# Altium footprint library pioneer_2-bluepill_eletronic_wrapper.PcbLib: 26 footprints (part 1 of 2)
Each footprint in its own frame and in the unit in brackets; x right, y up, seen from the top. Pads: shape width x height; smd on the part's side, far side on the other; paste and mask are expansions set on the pad; w line width, h text height; cw(c..) or ccw(c..) is an arc to the next point about the centre after c.
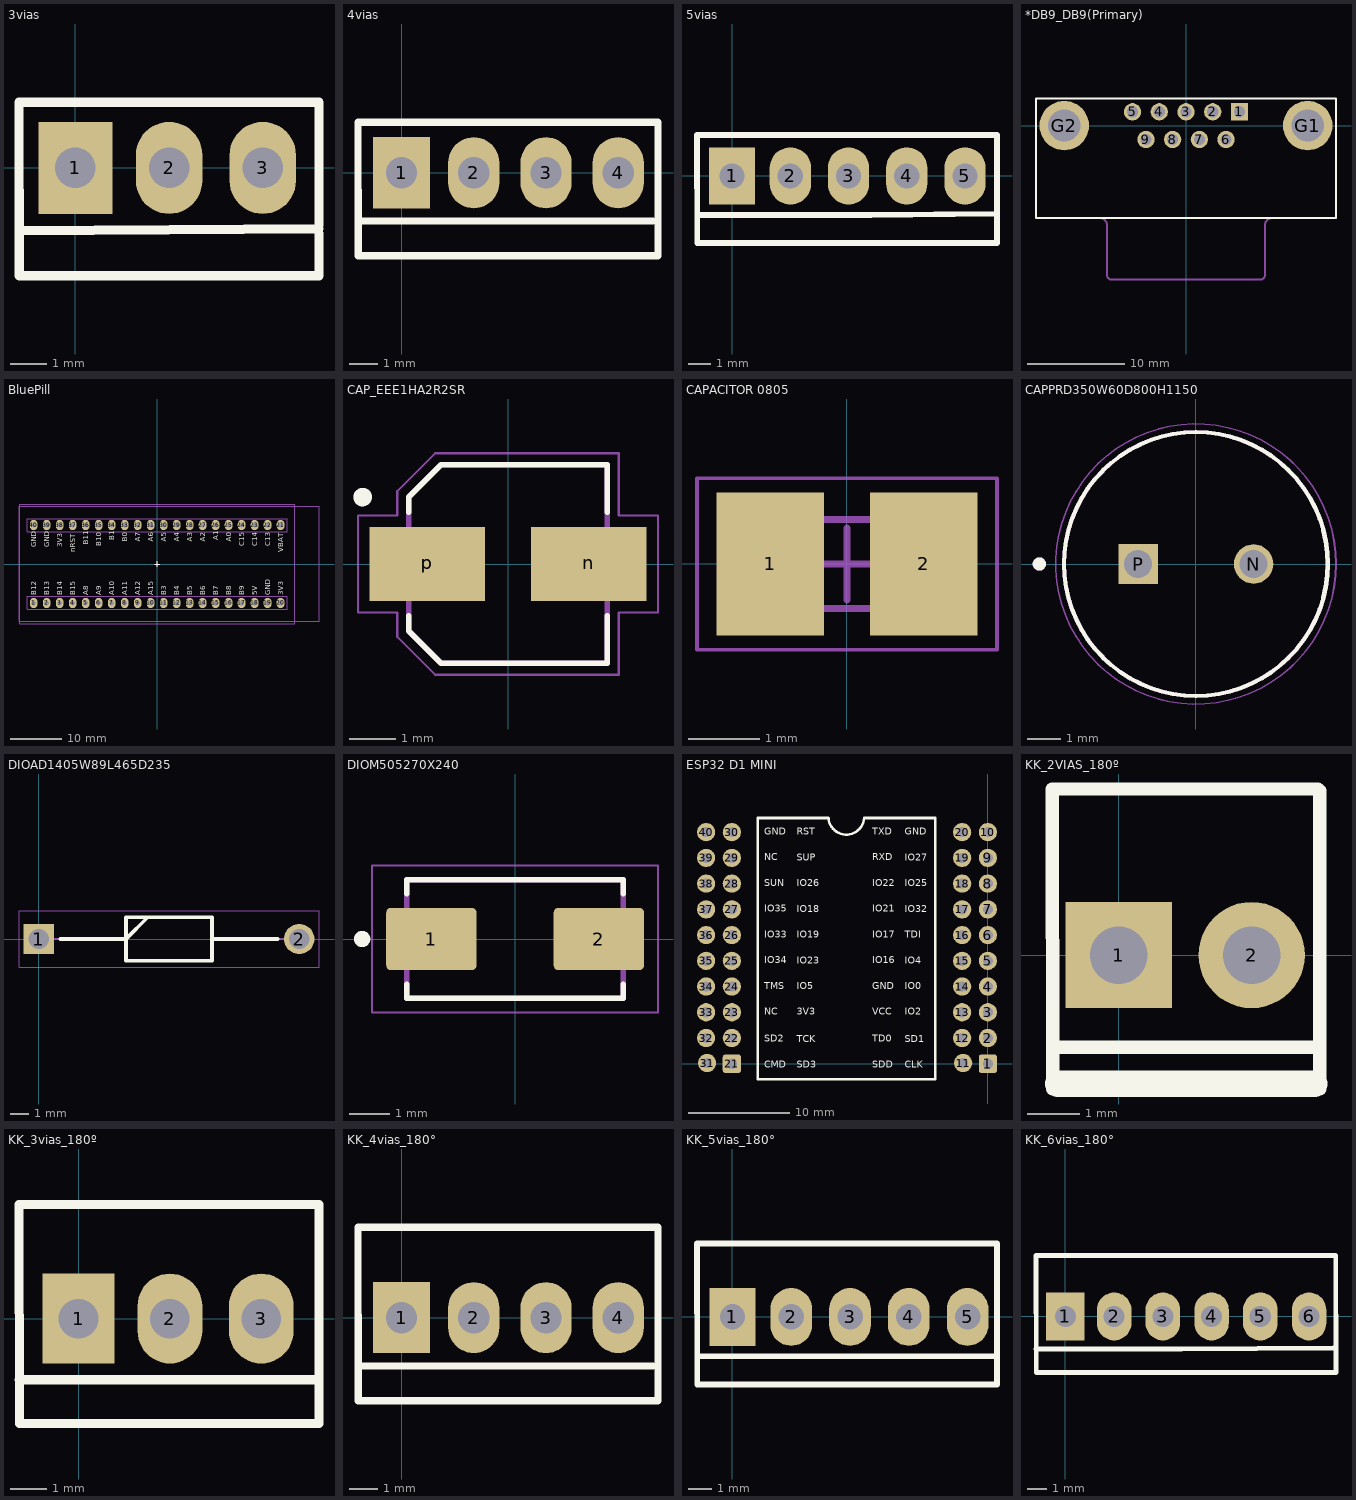
[diagram p0: the footprints below, top view; thin cyan lines are the x and y axes]

## 3vias [mm]
pads (3):
  rect 2x2.5 hole 1.1: 1(0,0)
  oval 1.8x2.5 hole 1.1: 2(2.54,0) 3(5.08,0)
Top Overlay:
  lines w0.254: -1.524,-1.7 6.604,-1.651 ; 6.604,-1.767 6.604,-2.921 -1.523,-2.921 -1.531,1.778 6.604,1.778 6.604,0.667 6.604,-1.556

## 4vias [mm]
pads (4):
  rect 2x2.5 hole 1.1: 1(0,0)
  oval 1.8x2.5 hole 1.1: 2(2.54,0) 3(5.08,0) 4(7.62,0)
Top Overlay:
  lines w0.254: -1.534,1.778 6.685,1.778 9.017,1.778 9.017,-2.667 9.017,-2.921 6.685,-2.921 -1.523,-2.921 -1.531,1.778 ; -1.524,-1.7 6.05,-1.7 8.841,-1.7

## 5vias [mm]
pads (5):
  rect 2x2.5 hole 1.1: 1(0,0)
  oval 1.8x2.5 hole 1.1: 2(2.54,0) 3(5.08,0) 4(7.62,0) 5(10.16,0)
Top Overlay:
  lines w0.254: -1.534,1.778 6.685,1.778 11.557,1.778 11.557,-2.921 9.017,-2.921 6.685,-2.921 -1.523,-2.921 -1.531,1.778 ; -1.524,-1.7 6.05,-1.7 11.557,-1.651

## *DB9_DB9(Primary) [mil]
pads (11):
  rect 70x70 hole 45: 1(216,56)
  round 70 hole 45: 2(108,56) 3(0,56) 4(-108,56) 5(-216,56) 6(162,-56) 7(54,-56) 8(-54,-56) 9(-162,-56)
  round 200 hole 130: G1(492,0) G2(-492,0)
Top Overlay:
  lines w8: -606.3,-374.02 -606.3,110.24 606.3,110.24 606.3,-374.02 -606.3,-374.02
Mechanical 4:
  lines w8: -320,-602.32 ccw(c-300,-602.32) -300,-622.32 ; -320,-602.32 ccw(c-300,-602.32) -300,-622.32 ; -320,-602.32 -320,-402.32 -320,-602.32 ; -300,-622.32 300,-622.32 ; -300,-622.32 300,-622.32 ; 300,-622.32 ccw(c300,-602.32) 320,-602.32 ; 300,-622.32 ccw(c300,-602.32) 320,-602.32 ; 320,-602.32 320,-402.32 320,-602.32 ; -344.79,-374.03 cw(c-346.65,-400.67) -320.01,-402.53 ccw(c-346.65,-400.67) -344.79,-374.03 ; 320.01,-402.53 cw(c346.65,-400.67) 344.79,-374.03 ccw(c346.65,-400.67) 320.01,-402.53
3D body "DB9 Male Right Angle Connector.step": height 483.27, standoff -136.81, extent -606.5,-610 606.5,122.28

## BluePill [mm] "BluePill"
height 19.68
pads (40):
  oval 1.5x2 hole 0.9: 1(-24.13,-7.62) 2(-21.59,-7.62) 3(-19.05,-7.62) 4(-16.51,-7.62) 5(-13.97,-7.62) 6(-11.43,-7.62) 7(-8.89,-7.62) 8(-6.35,-7.62) 9(-3.81,-7.62) 10(-1.27,-7.62) 11(1.27,-7.62) 12(3.81,-7.62) 13(6.35,-7.62) 14(8.89,-7.62) 15(11.43,-7.62) 16(13.97,-7.62) 17(16.51,-7.62) 18(19.05,-7.62) 19(21.59,-7.62) 20(24.13,-7.62) 21(24.13,7.62) 22(21.59,7.62) 23(19.05,7.62) 24(16.51,7.62) 25(13.97,7.62) 26(11.43,7.62) 27(8.89,7.62) 28(6.35,7.62) 29(3.81,7.62) 30(1.27,7.62) 31(-1.27,7.62) 32(-3.81,7.62) 33(-6.35,7.62) 34(-8.89,7.62) 35(-11.43,7.62) 36(-13.97,7.62) 37(-16.51,7.62) 38(-19.05,7.62) 39(-21.59,7.62) 40(-24.13,7.62)
Top Overlay:
  lines w0.2: -0.5,0 0.5,0 ; 0,-0.5 0,0.5
  text "GND" at -23.622,3.302 h1
  text "GND" at -21.082,3.302 h1
  text "3V3" at -18.542,3.302 h1
  text "nRST" at -16.002,2.302 h1
  text "B11" at -13.462,3.802 h1
  text "B10" at -10.922,3.469 h1
  text "B1" at -8.382,4.635 h1
  text "B0" at -5.842,4.302 h1
  text "A7" at -3.302,4.302 h1
  text "A6" at -0.762,4.302 h1
  text "A5" at 1.778,4.302 h1
  text "A4" at 4.318,4.302 h1
  text "VBAT" at 24.638,2.302 h1
  text "C13" at 22.098,3.469 h1
  text "C14" at 19.558,3.469 h1
  text "C15" at 17.018,3.469 h1
  text "A0" at 14.478,4.302 h1
  text "A1" at 11.938,4.635 h1
  text "A2" at 9.398,4.302 h1
  text "A3" at 6.858,4.302 h1
  text "B5" at 6.858,-6.096 h1
  text "B6" at 9.398,-6.096 h1
  text "B7" at 11.938,-6.096 h1
  text "B8" at 14.478,-6.096 h1
  text "B9" at 17.018,-6.096 h1
  text "5V" at 19.558,-6.096 h1
  text "GND" at 22.098,-6.096 h1
  text "3V3" at 24.638,-6.096 h1
  text "B4" at 4.318,-6.096 h1
  text "B3" at 1.778,-6.096 h1
  text "A15" at -0.762,-6.096 h1
  text "A12" at -3.302,-6.096 h1
  text "A11" at -5.842,-6.096 h1
  text "A10" at -8.382,-6.096 h1
  text "A9" at -10.922,-6.096 h1
  text "A8" at -13.462,-6.096 h1
  text "B15" at -16.002,-6.096 h1
  text "B14" at -18.542,-6.096 h1
  text "B13" at -21.082,-6.096 h1
  text "B12" at -23.622,-6.096 h1
Mechanical 13:
  lines w0.1: -27,-11.227 31.648,-11.227 31.648,11.273 -27,11.273 -27,-11.227 ; -25.4,-8.89 25.4,-8.89 25.4,-6.35 -25.4,-6.35 -25.4,-8.89 ; -25.4,6.35 -25.4,8.89 25.4,8.89 25.4,6.35 -25.4,6.35
Mechanical 15:
  lines w0.05: -26.9,-11.7 26.9,-11.7 26.9,11.7 -26.9,11.7 -26.9,-11.7
  lines w0.1: -0.5,0 0.5,0 ; 0,-0.5 0,0.5
Mechanical 29:
  text ".Designator" at 0,0 h1.52
3D body "BluePill.STEP": height 19.68, standoff -2.09, extent -26.988,-11.227 31.648,11.273

## CAP_EEE1HA2R2SR [mm]
pads (2):
  rect 2.5x1.6 smd: n(1.75,0) p(-1.75,0)
Top Overlay:
  circle w0.2: c-3.15,1.45 r0.1
  lines w0.127: -2.15,-1.12 -2.15,-1.45 -1.45,-2.15 2.15,-2.15 2.15,-1.12 ; -2.15,1.12 -2.15,1.45 -1.45,2.15 2.15,2.15 2.15,1.12
Mechanical 13:
  circle w0.2: c-3.15,1.45 r0.1
  lines w0.127: -2.15,-1.45 -1.45,-2.15 2.15,-2.15 2.15,2.15 -1.45,2.15 -2.15,1.45 -2.15,-1.45
Mechanical 15:
  lines w0.05: -3.25,-1.05 -3.25,1.05 -2.4,1.05 -2.4,1.575 -1.575,2.4 2.4,2.4 2.4,1.05 3.25,1.05 3.25,-1.05 2.4,-1.05 2.4,-2.4 -1.575,-2.4 -2.4,-1.575 -2.4,-1.05 -3.25,-1.05
3D body "step_temp.STEP": height 5.8, standoff 0, extent -2.5,-2.15 2.5,2.15

## CAPACITOR 0805 [mm] "ceramic capacitor 0805"
height 0.6
pads (2):
  rect 1.5x2 smd: 1(-1.075,0) 2(1.075,0)
Bottom Overlay:
  lines w0.2: -0.2,-0.6 0.2,-0.6 ; -0.2,0.6 0.2,0.6
Mechanical 13:
  lines w0.1: -1,-0.625 1,-0.625 1,0.625 -1,0.625 -1,-0.625
Mechanical 15:
  lines w0.05: -2.1,-1.2 2.1,-1.2 2.1,1.2 -2.1,1.2 -2.1,-1.2
  lines w0.1: -0.5,0 0.5,0 ; 0,-0.5 0,0.5
3D body "Ceramic_Capacitor_0805_h24mil.step": height 0.61, standoff 0.01, extent -1,-0.625 1,0.625

## CAPPRD350W60D800H1150 [mm]
pads (2):
  round 1.2 hole 0.85: N(1.75,0)
  rect 1.2x1.2 hole 0.85: P(-1.75,0)
Top Overlay:
  circle w0.127: c0,0 r4
  circle w0.2: c-4.75,0 r0.1
Mechanical 13:
  circle w0.127: c0,0 r4
  circle w0.2: c-4.75,0 r0.1
Mechanical 15:
  circle w0.05: c0,0 r4.25
3D body "step_temp.STEP": height 11.5, standoff -17, extent -4,-3.992 4,3.992

## DIOAD1405W89L465D235 [mm]
pads (2):
  rect 1.65x1.65 hole 1.1: 1(0,0)
  round 1.65 hole 1.1: 2(14.1,0)
Top Overlay:
  lines w0.2: 1.175,0 4.725,0 5.9,1.175 ; 9.375,0 12.925,0 ; 4.725,-1.175 4.725,1.175 9.375,1.175 9.375,-1.175 4.725,-1.175
Mechanical 13:
  lines w0.1: 0,0 4.725,0 5.9,1.175 ; 9.375,0 14.1,0 ; 4.725,-1.175 4.725,1.175 9.375,1.175 9.375,-1.175 4.725,-1.175
Mechanical 15:
  lines w0.05: -1.075,-1.525 -1.075,1.525 15.175,1.525 15.175,-1.525 -1.075,-1.525
3D body "1N4007-E3_53.stp": height 2.69, standoff -2.7, extent -0.441,-1.347 14.495,1.347

## DIOM505270X240 [mm]
pads (2):
  rrect15% 2.21x1.53 smd: 1(-2.05,0) 2(2.05,0)
Top Overlay:
  circle w0.2: c-3.746,0 r0.1
  lines w0.127: -2.65,-1.1 -2.65,-1.45 2.65,-1.45 2.65,-1.1 ; -2.65,1.1 -2.65,1.45 2.65,1.45 2.65,1.1
Mechanical 13:
  lines w0.127: -2.65,-1.45 2.65,-1.45 2.65,1.45 -2.65,1.45 -2.65,-1.45
Mechanical 15:
  lines w0.05: -3.5,-1.8 -3.5,1.8 3.5,1.8 3.5,-1.8 -3.5,-1.8
3D body "step_temp.STEP": height 2.37, standoff 0.2, extent -2.398,-1.27 2.652,1.43

## ESP32 D1 MINI [mm]
pads (40):
  rrect25% 1.8x1.8 hole 1: 1(0,0) 21(-25.273,0)
  round 1.8 hole 1: 2(0,2.54) 3(0,5.08) 4(0,7.62) 5(0,10.16) 6(0,12.7) 7(0,15.24) 8(0,17.78) 9(0,20.32) 10(0,22.86) 11(-2.442,0.072) 12(-2.54,2.54) 13(-2.54,5.08) 14(-2.54,7.62) 15(-2.54,10.16) 16(-2.54,12.7) 17(-2.54,15.24) 18(-2.54,17.78) 19(-2.54,20.32) 20(-2.54,22.86) 22(-25.273,2.54) 23(-25.273,5.08) 24(-25.273,7.62) 25(-25.273,10.16) 26(-25.273,12.7) 27(-25.273,15.24) 28(-25.273,17.78) 29(-25.273,20.32) 30(-25.273,22.86) 31(-27.715,0.072) 32(-27.813,2.54) 33(-27.813,5.08) 34(-27.813,7.62) 35(-27.813,10.16) 36(-27.813,12.7) 37(-27.813,15.24) 38(-27.813,17.78) 39(-27.813,20.32) 40(-27.813,22.86)
Top Overlay:
  lines w0.254: -22.733,-1.524 -5.207,-1.524 -5.207,24.257 -12.207,24.257 cw(c-13.97,24.384) -15.733,24.257 -22.733,24.257 -22.733,-1.524
  text "NC" at -22.098,4.826 h0.7
  text "TMS" at -22.098,7.366 h0.7
  text "IO34" at -22.098,9.906 h0.7
  text "IO33" at -22.098,12.446 h0.7
  text "IO35" at -22.098,14.986 h0.7
  text "SUN" at -22.098,17.526 h0.7
  text "NC" at -22.098,20.066 h0.7
  text "GND" at -22.098,22.606 h0.7
  text "CMD" at -22.098,-0.381 h0.7
  text "SD2" at -22.098,2.159 h0.7
  text "3V3" at -18.859,4.812 h0.7
  text "IO5" at -18.859,7.352 h0.7
  text "IO23" at -18.859,9.892 h0.7
  text "IO19" at -18.859,12.432 h0.7
  text "IO18" at -18.859,14.972 h0.7
  text "IO26" at -18.859,17.512 h0.7
  text "SUP" at -18.859,20.052 h0.7
  text "RST" at -18.859,22.592 h0.7
  text "SD3" at -18.859,-0.395 h0.7
  text "TCK" at -18.859,2.145 h0.7
  text "VCC" at -11.43,4.826 h0.7
  text "GND" at -11.43,7.366 h0.7
  text "IO16" at -11.43,9.906 h0.7
  text "IO17" at -11.43,12.446 h0.7
  text "IO21" at -11.43,14.986 h0.7
  text "IO22" at -11.43,17.526 h0.7
  text "RXD" at -11.43,20.066 h0.7
  text "TXD" at -11.43,22.606 h0.7
  text "SDD" at -11.43,-0.381 h0.7
  text "TD0" at -11.43,2.159 h0.7
  text "IO2" at -8.191,4.812 h0.7
  text "IO0" at -8.191,7.352 h0.7
  text "IO4" at -8.191,9.892 h0.7
  text "TDI" at -8.191,12.432 h0.7
  text "IO32" at -8.191,14.972 h0.7
  text "IO25" at -8.191,17.512 h0.7
  text "IO27" at -8.191,20.052 h0.7
  text "GND" at -8.191,22.592 h0.7
  text "CLK" at -8.191,-0.395 h0.7
  text "SD1" at -8.191,2.145 h0.7
3D body "Wemos ESP32 D1 Mini + F.stp": height 12.22, standoff -0.28, extent -29.337,-8.69 1.663,30.734

## KK_2VIAS_180º [mil]
pads (2):
  rect 80x80 hole 43.31: 1(0,0)
  round 80 hole 43.31: 2(100,0)
Top Overlay:
  lines w10: -49.66,-69.44 149.76,-69.44 ; -49.61,-100.79 -50,125 150,125 ; 151.18,-100.79 151.18,123.62
  lines w19.68: -45.67,-96.85 147.24,-96.85
3D body "User Library-Molex 2 pines.STEP": height 468.48, standoff -133.84, extent -61.38,-108.11 165,128.11

## KK_3vias_180º [mm]
pads (3):
  rect 2x2.5 hole 1.1: 1(0,0)
  oval 1.8x2.5 hole 1.1: 2(2.54,0) 3(5.08,0)
Top Overlay:
  lines w0.254: -1.651,-1.7 6.685,-1.7 ; -1.655,3.175 -1.644,-2.921 6.685,-2.921 6.685,3.175 -1.655,3.175
3D body "User Library-Molex 3 pines.step": height 11.9, standoff -3.38, extent -1.605,-2.952 6.685,3.048

## KK_4vias_180° [mm]
pads (4):
  rect 2x2.5 hole 1.1: 1(0,0)
  oval 1.8x2.5 hole 1.1: 2(2.54,0) 3(5.08,0) 4(7.62,0)
Top Overlay:
  lines w0.254: -1.524,-1.7 6.05,-1.7 8.841,-1.7 ; -1.534,3.175 6.685,3.175 9.017,3.175 9.017,-2.667 9.017,-2.921 6.685,-2.921 -1.523,-2.921 -1.534,3.175
3D body "KK_2.54_4VIAS.stp": height 11.72, standoff -3.54, extent -1.397,-2.794 8.763,3.006

## KK_5vias_180° [mm]
pads (5):
  rect 2x2.5 hole 1.1: 1(0,0)
  oval 1.8x2.5 hole 1.1: 2(2.54,0) 3(5.08,0) 4(7.62,0) 5(10.16,0)
Top Overlay:
  lines w0.254: -1.524,-1.7 6.05,-1.7 11.303,-1.7 ; -1.534,3.175 6.685,3.175 11.43,3.175 11.43,-2.921 9.017,-2.921 6.685,-2.921 -1.523,-2.921 -1.534,3.175
3D body "KK_2.54_5VIAS.stp": height 11.72, standoff -3.54, extent -1.397,-2.794 11.303,3.006

## KK_6vias_180° [mm]
pads (6):
  rect 2x2.5 hole 1.1: 1(0,0)
  oval 1.8x2.5 hole 1.1: 2(2.54,0) 3(5.08,0) 4(7.62,0) 5(10.16,0) 6(12.7,0)
Top Overlay:
  lines w0.254: -1.524,-1.7 6.05,-1.7 13.97,-1.642 ; 14.097,-2.921 9.017,-2.921 6.685,-2.921 -1.523,-2.921 -1.534,3.175 6.685,3.175 14.096,3.175 14.107,-2.921
3D body "User Library-molex kk 0_1in latching 6 way vertical header.STEP": height 11.7, standoff -3.54, extent -1.397,-2.794 13.843,3.048